# Altium integrated library Integrated Chips.IntLib: 79 symbols (continued)
## S9KEAZ128AMLK
designator U?
32-bit MCU core from ARM’s Cortex-M class, 1.77 CoreMark®/MHz from / single-cycle access memories, 48 MHz CPU frequency
footprint LQFP80_65P (LQFP, 80-Leads, Body 14.00x14.00mm, Pitch 0.65mm, IPC Medium Density)
pins: 1 PTD1/KBI0P25/FTM2CH3/MOSI1 (io), 2 PTD0/KBI0P24/FTM2CH2/SCK1 (io), 3 PTH7/KBI1P31/PWTIN1 (io), 4 PTH6/KBI1P30 (io), 5 PTH5/KBI1P29 (io), 6 PTE7/KBI1P7/TCLK2/FTM1CH1/CAN_TX (io), 7 PTH2/KBI1P26/BUSOUT/FTM1CH0/CAN_RX (io), 8 VDD1 (power), 9 VDDA/VREFH (power), 10 VREFH (power), 11 VREFL (power), 12 VSSA/VSS1 (power), 13 PTB7/KBI0P15/SCL0/EXTAL, 14 PTB6/KBI0P14/SDA0/XTAL, 15 PTI4/IRQ (io), 16 PTI1/IRQ/TX2 (io), 17 PTI0/IRQ/RX2 (io), 18 PTH1/KBI1P25/FTM2CH1 (io), 19 PTH0/KBI1P24/FTM2CH0 (io), 20 PTE6/KBI1P6 (io), 21 PTE5/KBI1P5 (io), 22 PTB5/KBI0P13/FTM2CH5/SS0/ACMP1_OUT (io), 23 PTB4/KBI0P12/FTM2CH4/MISO0/NMI/ACMP1_IN2 (io), 24 PTC3/KBI0P19/FTM2CH3/ADPC11 (io), 25 PTC2/KBI0P18/FTM2CH2/ADPC10 (io), 26 PTD7/KBI0P31/TX2 (io), 27 PTD6/KBI0P30/RX2 (io), 28 PTD5/KBI0P29/PWTIN0 (io), 29 PTI6/IRQ (io), 30 PTI5/IRQ (io), 31 PTC1/KBI0P17/FTM2CH1/ADPC9 (io), 32 PTC0/KBI0P16/FTM2CH0/ADPC8 (io), 33 PTH4/KBI1P28/SCL1 (io), 34 PTH3/KBI1P27/SDA1 (io), 35 PTF7/KBI1P15/ADPC15 (io), 36 PTF6/KBI1P14/ADPC14 (io), 37 PTF5/KBI1P13/ADPC13 (io), 38 PTF4/KBI1P12/ADPC12 (io), 39 PTB3/KBI0P11/MOSI0/FTM0CH1/ADPC7 (io), 40 PTB2/KBI0P10/SCK0/FTM0CH0/ADPC6 (io), 41 PTB1/KBI0P9/TX0/ADPC5 (io), 42 PTB0/KBI0P8/RX0/PWTIN1/ADPC4 (io), 43 PTF3/KBI1P11/TX1 (io), 44 PTF2/KBI1P10/RX1 (io), 45 PTA7/KBI0P7/FTM2FLT2/ACMP1_IN1/ADPC3 (io), 46 PTA6/KBI0P6/FTM2FLT1/ACMP1_IN0/ADPC2 (io), 47 PTE4/KBI1P4 (io), 48 VSS3 (power), 49 VDD3 (power), 50 PTG7/KBI1P23/FTM2CH5/SS1 (io), 51 PTG6/KBI1P22/FTM2CH4/MISO1 (io), 52 PTG5/KBI1P21/FTM2CH3/MOSI1 (io), 53 PTG4/KBI1P20/FTM2CH2/SCK1 (io), 54 PTF1/KBI1P9/FTM2CH1 (io), 55 PTF0/KBI1P8/FTM2CH0 (io), 56 PTD4/KBI0P28 (io), 57 PTD3/KBI0P27/SS1 (io), 58 PTD2/KBI0P26/MISO1 (io), 59 PTA3/KBI0P3/TX0/SCL0 (io), 60 PTA2/KBI0P2/RX0/SDA0 (io), 61 PTA1/KBI0P1/FTM0CH1/SDA0_OUT/ACMP0_IN1/ADPC1 (io), 62 PTA0/KBI0P0/FTM0CH0/SCL0_OUT/ACMP0_IN0/ADPC0 (io), 63 PTC7/KBI0P23/TX1/CAN_TX (io), 64 PTC6/KBI0P22/RX1/CAN_RX (io), 65 PTI3/IRQ (io), 66 PTI2/IRQ (io), 67 PTE3/KBI1P3/SS0 (io), 68 PTE2/KBI1P2/MISO0/PWTIN0 (io), 69 VSS2 (power), 70 VDD2 (power), 71 PTG3/KBI1P19 (io), 72 PTG2/KBI1P18 (io), 73 PTG1/KBI1P17 (io), 74 PTG0/KBI1P16 (io), 75 PTE1/KBI1P1/MOSI0/SCL1 (io), 76 PTE0/KBI1P0/SCK0/TCLK1/SDA1 (io), 77 PTC5/KBI0P21/FTM1CH1/RTCO (io), 78 PTC4/KBI0P20/RTCO/FTM1CH0/ACMP0_IN2/SWCLK (io), 79 PTA5/KBI0P5/IRQ/TCLK0/RESET (io), 80 PTA4/KBI0P4/ACMP0_OUT/SWDIO (io)

## SN65HVD230D
designator U?, comment SN65HVD232D
3.3V CAN Transceiver with Standby Mode, 17 mA, -40 to 85 degC, 8-pin SOIC (D), Green (RoHS & no Sb/Br); Manufacturer: Texas Instruments; PartNumber: SN65HVD230D; Drivers Per Package: 1; Transient Pulse Protection(V): -25 to 25; ICC(Max)(mA): 17; Supply Voltage(s)(V): 3.3; Rating: Catalog; DatasheetVersion: SLOS346K; PackageVersion: revM, Jun-2011; PackageReference: D8; PackageDescription: 8-Pin Plastic Small Outline Integrated Circuit, 4.9 x 3.9 mm, Pitch 1.27 mm Pitch; Supplier 1: Digi-Key; Supplier Part Number 1: SN65HVD230D-ND; Supplier 2: Farnell; Supplier Part Number 2: 1103105; Supplier 3: Newark; Supplier Part Number 3: 75C7744; Supplier 4: Mouser; Supplier Part Number 4: 595-SN65HVD230D; Eco-Plan: Green (RoHS & no Sb/Br); SubFamily: CAN; Receivers Per Package: 1; Isolated: No; Low Power Mode: Standby; Footprint: PCA82C250; Mounting Technology: Surface Mount; Code_JEDEC: MS-012AA; ComponentLink1Description: Datasheet; ComponentLink1URL: http://www.ti.com/general/docs/lit/getliterature.tsp?genericPartNumber=SN65HVD230&fileType=pdf
footprint SOIC8_150
pins: 1 D (in) "Driver input", 2 GND (power) "Ground", 3 VCC (power) "Supply voltage", 4 R (out) "Receiver output", 5 VREF (out) "Reference output", 6 CANL (io) "Low bus output", 7 CANH (io) "High bus output", 8 RS (in) "Standby/slope control"

## SN65HVD888
designator U?
RS-485 转发器  具有 IEC-ESD 保护的总线极性纠正 300bps 至 250kbps
footprint SOIC8_150
pins: 1 R, 2 ~{RE}, 3 DE, 4 D, 5 GND, 6 A, 7 B, 8 Vcc

## SN74LVC1G08
designator U?
footprint SOT23_5 (SOT23, 5-Leads, Body 2.90x2.70mm, Pitch 0.95mm, IPC Medium Density)
pins: 1 A, 2 B, 3 GND, 4 Y, 5 VCC

## SRV05-4
designator TVS?
footprint SOT23_6 (SOT23, 6-Leads, Body 2.90x2.80mm, Pitch 0.95mm, IPC Medium Density)
pins: 1, 2, 3, 4, 5, 6

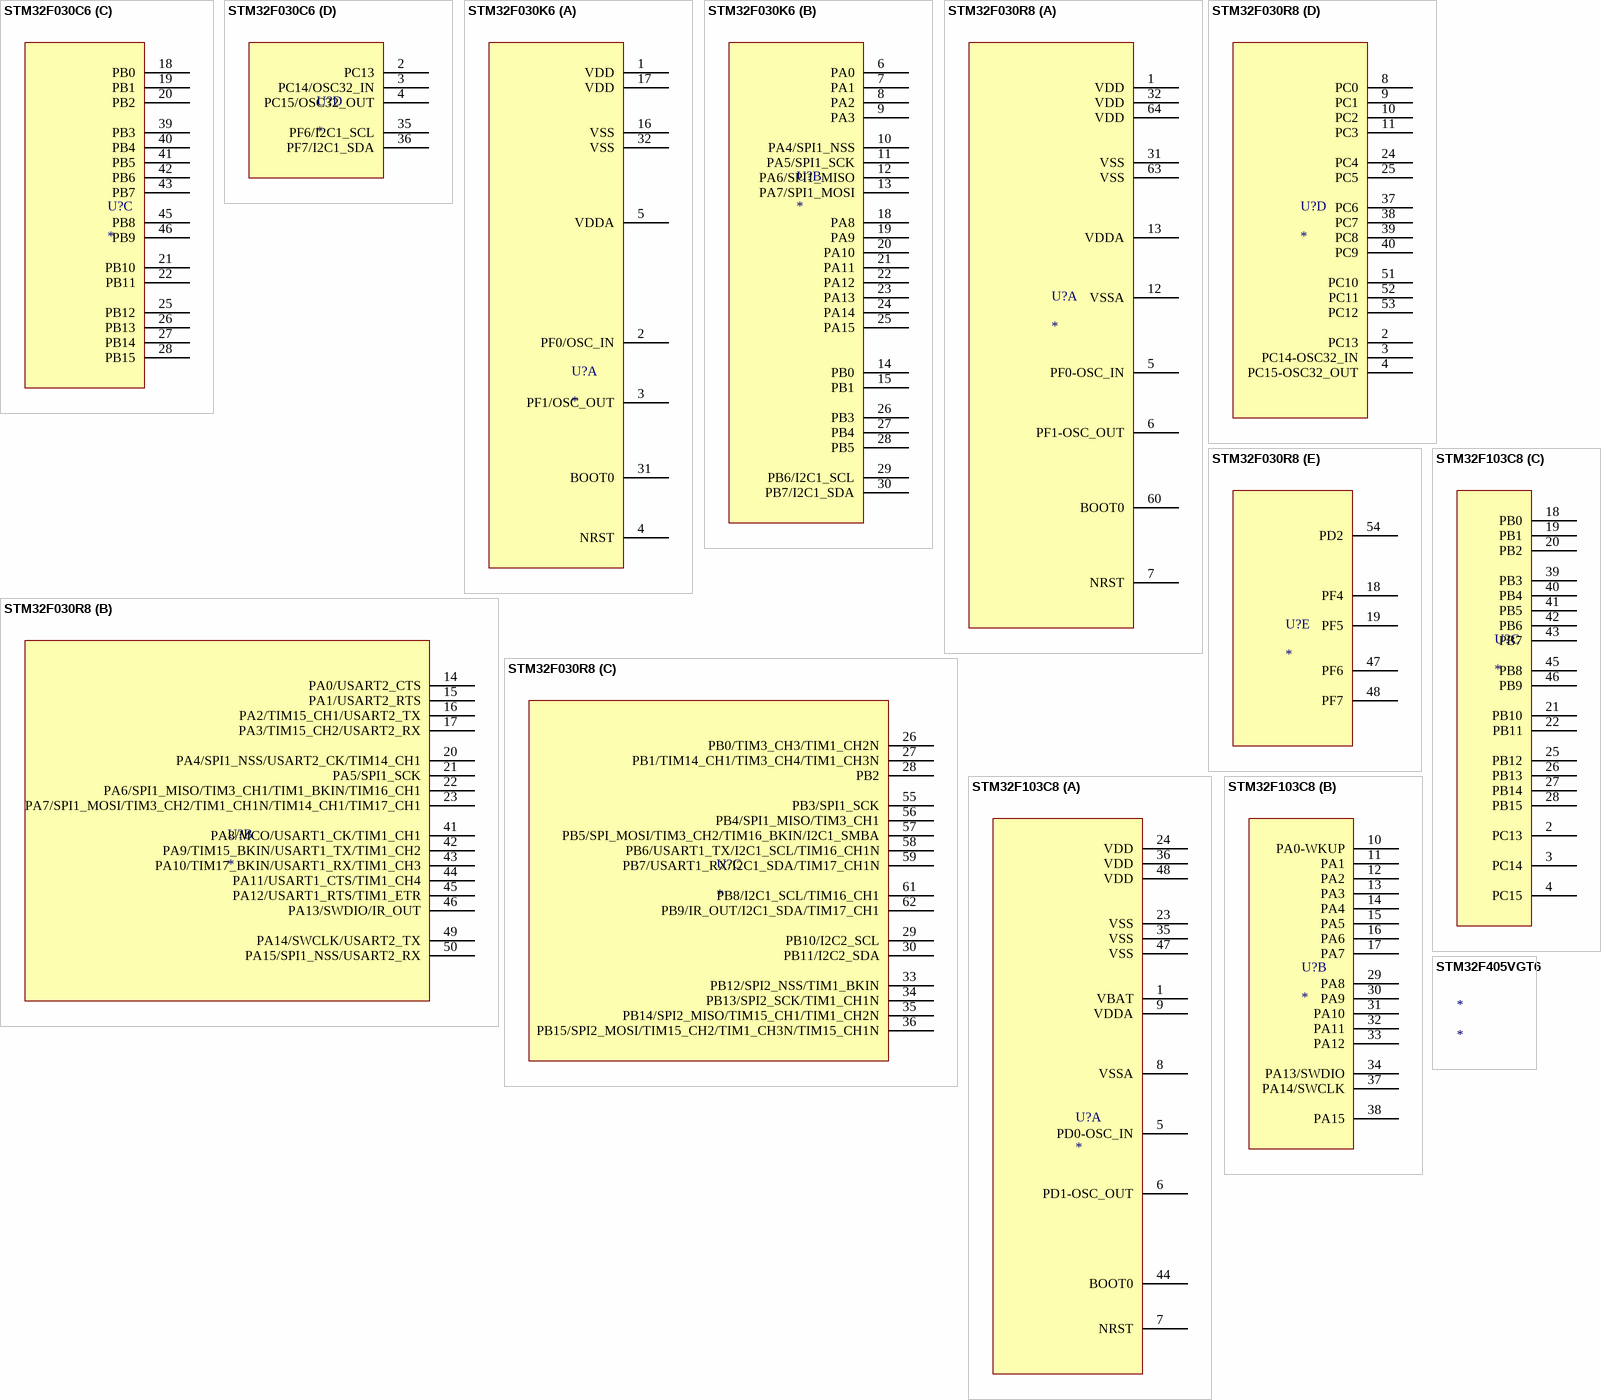
[diagram p3: symbols STM32F030C6 to STM32F405VGT6]

## STM32F030C6
designator U?
footprint LQFP48_50P (TSQFP, 48-Leads, Body 7.00x7.00mm, Pitch 0.50mm, IPC Medium Density)
part A pins: 1 VDD (power), 5 PF0/OSC_IN, 6 PF1/OSC_OUT, 7 NRST, 8 VSSA (power), 9 VDDA (power), 23 VSS (power), 24 VDD (power), 44 BOOT0, 47 VSS (power), 48 VDD (power)
part B pins: 10 PA0, 11 PA1, 12 PA2, 13 PA3, 14 PA4/SPI1_NSS, 15 PA5/SPI1_SCK, 16 PA6/SPI1_MISO, 17 PA7/SPI1_MOSI, 29 PA8, 30 PA9, 31 PA10, 32 PA11, 33 PA12, 34 PA13/SWDIO, 37 PA14/SWCLK, 38 PA15
part C pins: 18 PB0, 19 PB1, 20 PB2, 21 PB10, 22 PB11, 25 PB12, 26 PB13, 27 PB14, 28 PB15, 39 PB3, 40 PB4, 41 PB5, 42 PB6, 43 PB7, 45 PB8, 46 PB9
part D pins: 2 PC13, 3 PC14/OSC32_IN, 4 PC15/OSC32_OUT, 35 PF6/I2C1_SCL, 36 PF7/I2C1_SDA

## STM32F030K6
designator U?
footprint LQFP32_80P (TQFP, 32-Leads, Body 7.00x7.00mm, Pitch 0.80mm, IPC Medium Density)
part A pins: 1 VDD (power), 2 PF0/OSC_IN, 3 PF1/OSC_OUT, 4 NRST, 5 VDDA (power), 16 VSS (power), 17 VDD (power), 31 BOOT0, 32 VSS (power)
part B pins: 6 PA0, 7 PA1, 8 PA2, 9 PA3, 10 PA4/SPI1_NSS, 11 PA5/SPI1_SCK, 12 PA6/SPI1_MISO, 13 PA7/SPI1_MOSI, 14 PB0, 15 PB1, 18 PA8, 19 PA9, 20 PA10, 21 PA11, 22 PA12, 23 PA13, 24 PA14, 25 PA15, 26 PB3, 27 PB4, 28 PB5, 29 PB6/I2C1_SCL, 30 PB7/I2C1_SDA

## STM32F030R8
designator U?
footprint LQFP64_50P (TSQFP, 64-Leads, Body 10.00x10.00mm, Pitch 0.50mm, IPC Medium Density)
part A pins: 1 VDD (power), 5 PF0-OSC_IN, 6 PF1-OSC_OUT, 7 NRST, 12 VSSA (power), 13 VDDA (power), 31 VSS (power), 32 VDD (power), 60 BOOT0, 63 VSS (power), 64 VDD (power)
part B pins: 14 PA0/USART2_CTS, 15 PA1/USART2_RTS, 16 PA2/TIM15_CH1/USART2_TX, 17 PA3/TIM15_CH2/USART2_RX, 20 PA4/SPI1_NSS/USART2_CK/TIM14_CH1, 21 PA5/SPI1_SCK, 22 PA6/SPI1_MISO/TIM3_CH1/TIM1_BKIN/TIM16_CH1, 23 PA7/SPI1_MOSI/TIM3_CH2/TIM1_CH1N/TIM14_CH1/TIM17_CH1, 41 PA8/MCO/USART1_CK/TIM1_CH1, 42 PA9/TIM15_BKIN/USART1_TX/TIM1_CH2, 43 PA10/TIM17_BKIN/USART1_RX/TIM1_CH3, 44 PA11/USART1_CTS/TIM1_CH4, 45 PA12/USART1_RTS/TIM1_ETR, 46 PA13/SWDIO/IR_OUT, 49 PA14/SWCLK/USART2_TX, 50 PA15/SPI1_NSS/USART2_RX
part C pins: 26 PB0/TIM3_CH3/TIM1_CH2N, 27 PB1/TIM14_CH1/TIM3_CH4/TIM1_CH3N, 28 PB2, 29 PB10/I2C2_SCL, 30 PB11/I2C2_SDA, 33 PB12/SPI2_NSS/TIM1_BKIN, 34 PB13/SPI2_SCK/TIM1_CH1N, 35 PB14/SPI2_MISO/TIM15_CH1/TIM1_CH2N, 36 PB15/SPI2_MOSI/TIM15_CH2/TIM1_CH3N/TIM15_CH1N, 55 PB3/SPI1_SCK, 56 PB4/SPI1_MISO/TIM3_CH1, 57 PB5/SPI_MOSI/TIM3_CH2/TIM16_BKIN/I2C1_SMBA, 58 PB6/USART1_TX/I2C1_SCL/TIM16_CH1N, 59 PB7/USART1_RX/I2C1_SDA/TIM17_CH1N, 61 PB8/I2C1_SCL/TIM16_CH1, 62 PB9/IR_OUT/I2C1_SDA/TIM17_CH1
part D pins: 2 PC13, 3 PC14-OSC32_IN, 4 PC15-OSC32_OUT, 8 PC0, 9 PC1, 10 PC2, 11 PC3, 24 PC4, 25 PC5, 37 PC6, 38 PC7, 39 PC8, 40 PC9, 51 PC10, 52 PC11, 53 PC12
part E pins: 18 PF4, 19 PF5, 47 PF6, 48 PF7, 54 PD2

## STM32F103C8
designator U?
footprint Model Name (Footprint not found)
footprint LQFP48_50P (TSQFP, 48-Leads, Body 7.00x7.00mm, Pitch 0.50mm, IPC Medium Density)
part A pins: 1 VBAT (power), 5 PD0-OSC_IN, 6 PD1-OSC_OUT, 7 NRST, 8 VSSA (power), 9 VDDA (power), 23 VSS (power), 24 VDD (power), 35 VSS (power), 36 VDD (power), 44 BOOT0, 47 VSS (power), 48 VDD (power)
part B pins: 10 PA0-WKUP, 11 PA1, 12 PA2, 13 PA3, 14 PA4, 15 PA5, 16 PA6, 17 PA7, 29 PA8, 30 PA9, 31 PA10, 32 PA11, 33 PA12, 34 PA13/SWDIO, 37 PA14/SWCLK, 38 PA15
part C pins: 2 PC13, 3 PC14, 4 PC15, 18 PB0, 19 PB1, 20 PB2, 21 PB10, 22 PB11, 25 PB12, 26 PB13, 27 PB14, 28 PB15, 39 PB3, 40 PB4, 41 PB5, 42 PB6, 43 PB7, 45 PB8, 46 PB9

## STM32F405VGT6
designator *

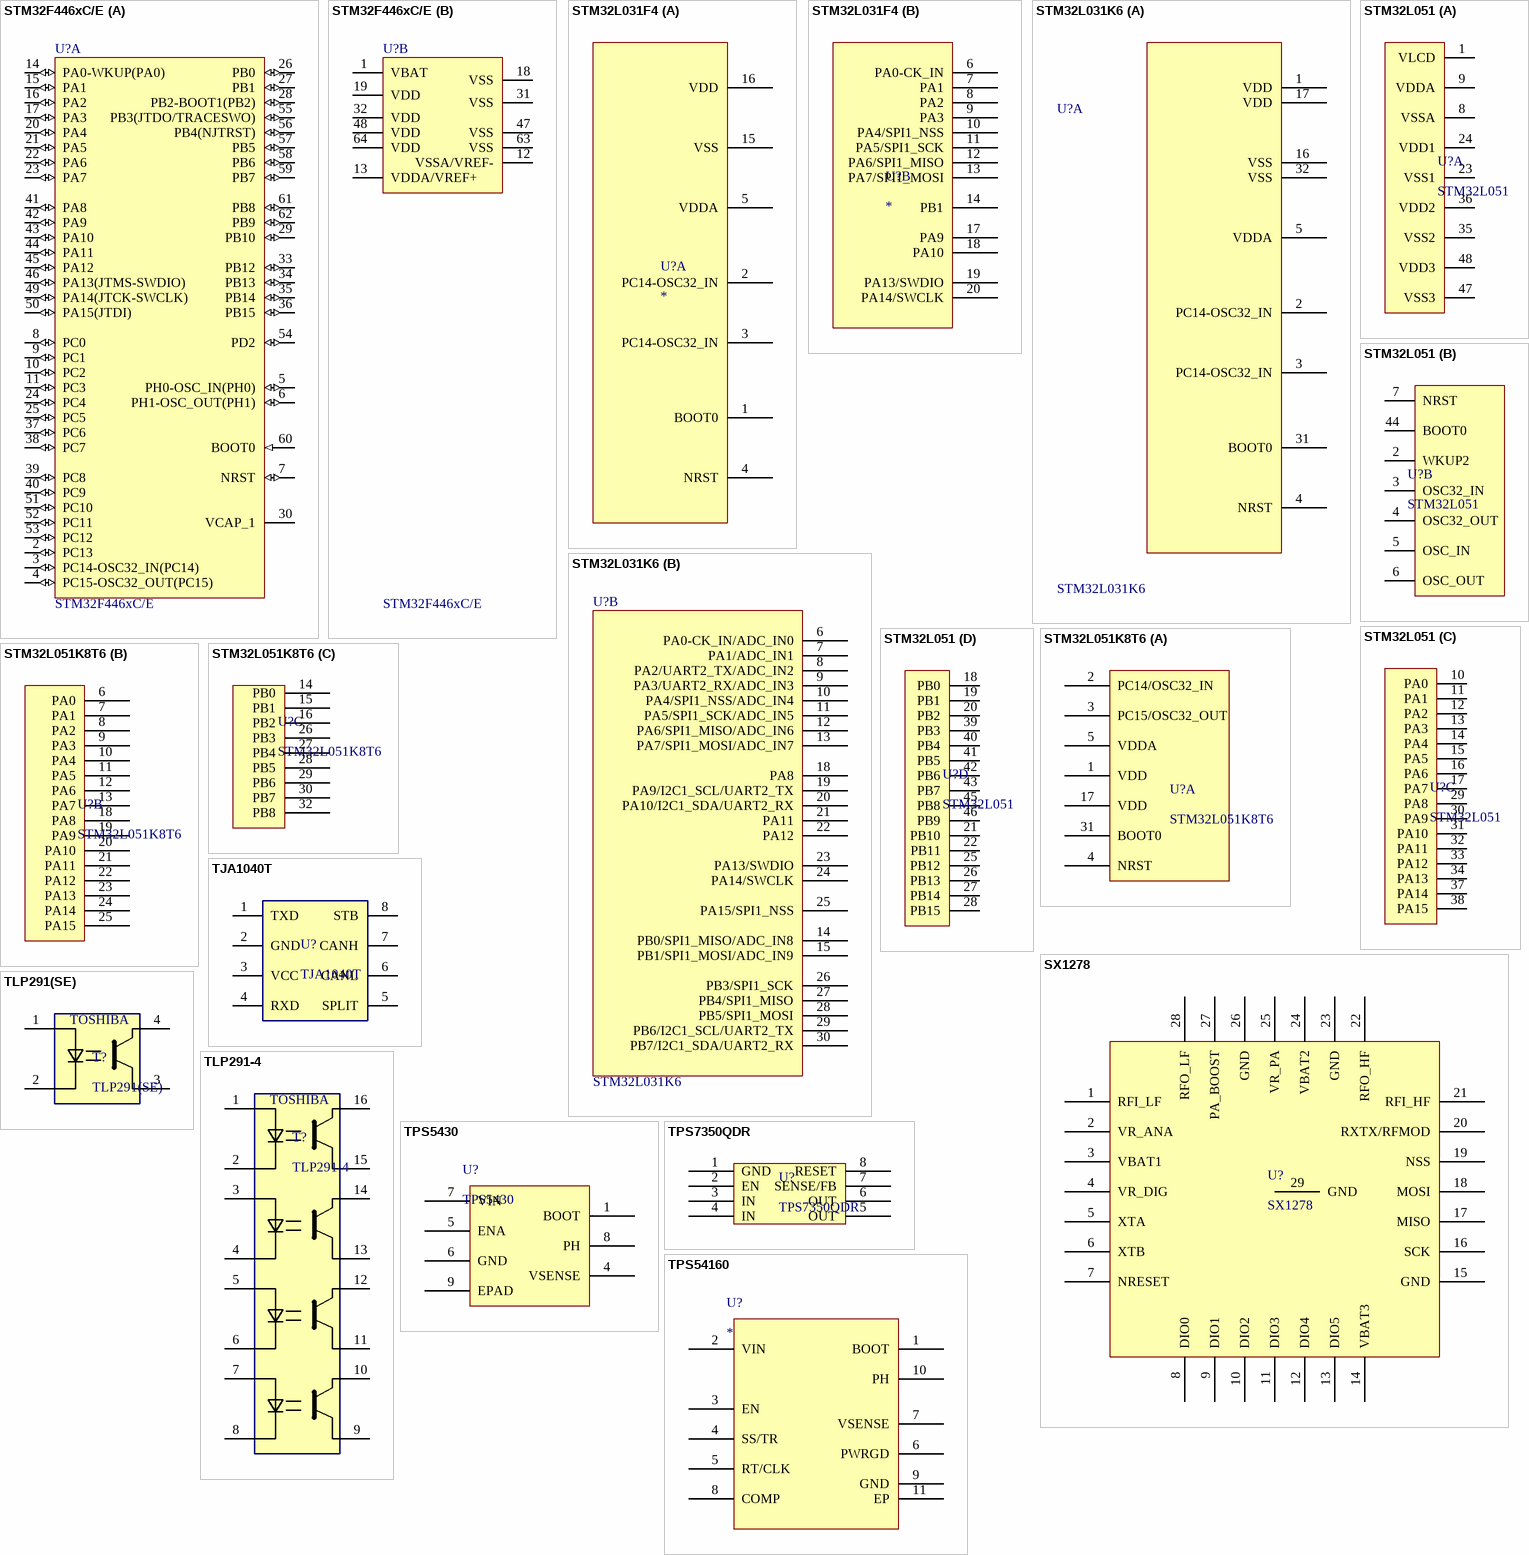
[diagram p4: symbols STM32F446xC/E to TPS54160]

## STM32F446xC/E
designator U?
ARM Cortex-M4 32-bit MCU+FPU, 210 DMIPS, 1024 kB Flash, 192 kB Internal RAM, 51 I/Os, 64-pin LQFP, -40 to 85 degC, Tray; Manufacturer: STMicroelectronics; PartNumber: STM32F405RGT6; D/A Converter: 2x12-bit; FLASH Size (Prog) (kB): 1024; I/Os (High Current): 51; Internal RAM Size (kB): 192; Operating Frequency(F) (Processor speed) (MHz): 168; Supply Voltage(Vcc) max (V): 3.6; Supply Voltage(Vcc) min (V): 1.8; DatasheetVersion: Rev. 4; PackageVersion: Rev. 4, 06/2013; PackageReference: LQFP64; PackageDescription: 64-Pin Low Profile Quad Flat Package, 10 x 10 mm Body, 0.5 mm Pitch; Supplier 1: Digi-Key; Supplier Part Number 1: 497-11767-ND; Supplier 2: Farnell; Supplier Part Number 2: 2064363; Supplier 3: Newark; Supplier Part Number 3: 73T2329; Supplier 4: Mouser; Supplier Part Number 4: 511-STM32F405RGT6; Core: ARM Cortex-M4; Packing: Tray; Mounting Technology: Surface Mount; ComponentLink1Description: Manufacturer URL; ComponentLink1URL: http://www.st.com/web/en/home.html; ComponentLink2Description: Datasheet; ComponentLink2URL: http://www.st.com/st-web-ui/static/active/en/resource/technical/document/datasheet/DM00037051.pdf; ComponentLink3Description: Package Specification; ComponentLink3URL: http://www.st.com/st-web-ui/static/active/en/resource/technical/document/datasheet/DM00037051.pdf
footprint LQFP64_50P (TSQFP, 64-Leads, Body 10.00x10.00mm, Pitch 0.50mm, IPC Medium Density)
part A pins: 2 PC13 (io) "PC13/EVENTOUT/RTC_OUT,RTC_TAMP1,RTC_TS", 3 PC14-OSC32_IN(PC14) (io) "PC14-OSC32_IN(PC14)/EVENTOUT/OSC32_IN", 4 PC15-OSC32_OUT(PC15) (io) "PC15-OSC32_OUT(PC15)/EVENTOUT/OSC32_OUT", 5 PH0-OSC_IN(PH0) (io) "PH0-OSC_IN(PH0)/EVENTOUT/OSC_IN", 6 PH1-OSC_OUT(PH1) (io) "PH1-OSC_OUT(PH1)/EVENTOUT/OSC_OUT", 7 NRST (io), 8 PC0 (io) "PC0/OTG_HS_ULPI_STP/EVENTOUT/ADC123_IN10", 9 PC1 (io) "PC1/ETH_MDC/EVENTOUT/ADC123_IN11", 10 PC2 (io) "PC2/SPI2_MISO/OTG_HS_ULPI_DIR/ETH_MII_TXD2/I2S2ext_SD/EVENTOUT/ADC123_IN12", 11 PC3 (io) "PC3/SPI2_MOSI/I2S2_SD/OTG_HS_ULPI_NXT/ETH_MII_TX_CLK/EVENTOUT/ADC123_IN13", 14 PA0-WKUP(PA0) (io) "PA0-WKUP(PA0)/USART2_CTS/UART4_TX/ETH_MII_CRS/TIM2_CH1_ETR/TIM5_CH1/TIM8_ETR/EVENTOUT/ADC123_IN0/WKUP", 15 PA1 (io) "PA1/USART2_RTS/UART4_RX/ETH_RMII_REF_CLK/ETH_MII_RX_CLK/TIM5_CH2/TIM2_CH2/EVENTOUT/ADC123_IN1", 16 PA2 (io) "PA2/USART2_TX/TIM5_CH3/TIM9_CH1/TIM2_CH3/ETH_MDIO/EVENTOUT/ADC123_IN2", 17 PA3 (io) "PA3/USART2_RX/TIM5_CH4/TIM9_CH2/TIM2_CH4/OTG_HS_ULPI_D0/ETH_MII_COL/EVENTOUT/ADC123_IN3", 20 PA4 (io) "PA4/SPI1_NSS/SPI3_NSS/USART2_CK/DCMI_HSYNC/OTG_HS_SOF/I2S3_WS/EVENTOUT/ADC12_IN4/DAC_OUT1", 21 PA5 (io) "PA5/SPI1_SCK/OTG_HS_ULPI_CK/TIM2_CH1_ETR/TIM8_CH1N/EVENTOUT/ADC12_IN5/DAC_OUT2", 22 PA6 (io) "PA6/SPI1_MISO/TIM8_BKIN/TIM13_CH1/DCMI_PIXCLK/TIM3_CH1/TIM1_BKIN/EVENTOUT/ADC12_IN6", 23 PA7 (io) "PA7/SPI1_MOSI/TIM8_CH1N/TIM14_CH1/TIM3_CH2/ETH_MII_RX_DV/TIM1_CH1N/ETH_RMII_CRS_DV/EVENTOUT/ADC12_IN7", 24 PC4 (io) "PC4/ETH_RMII_RX_D0/ETH_MII_RX_D0/EVENTOUT/ADC12_IN14", 25 PC5 (io) "PC5/ETH_RMII_RX_D1/ETH_MII_RX_D1/EVENTOUT/ADC12_IN15", 26 PB0 (io) "PB0/TIM3_CH3/TIM8_CH2N/OTG_HS_ULPI_D1/ETH_MII_RXD2/TIM1_CH2N/EVENTOUT/ADC12_IN8", 27 PB1 (io) "PB1/TIM3_CH4/TIM8_CH3N/OTG_HS_ULPI_D2/ETH_MII_RXD3/TIM1_CH3N/EVENTOUT/ADC12_IN9", 28 PB2-BOOT1(PB2) (io) "PB2-BOOT1(PB2)/EVENTOUT", 29 PB10 (io) "PB10/SPI2_SCK/I2S2_CK/I2C2_SCL/USART3_TX/OTG_HS_ULPI_D3/ETH_MII_RX_ER/TIM2_CH3/EVENTOUT", 30 VCAP_1 (power), 33 PB12 (io) "PB12/SPI2_NSS/I2S2_WS/I2C2_SMBA/USART3_CK/TIM1_BKIN/CAN2_RX/OTG_HS_ULPI_D5/ETH_RMII_TXD0/ETH_MII_TXD0/OTG_HS_ID/EVENTOUT", 34 PB13 (io) "PB13/SPI2_SCK/I2S2_CK/USART3_CTS/TIM1_CH1N/CAN2_TX/OTG_HS_ULPI_D6/ETH_RMII_TXD1/ETH_MII_TXD1/EVENTOUT/OTG_HS_VBUS", 35 PB14 (io) "PB14/SPI2_MISO/TIM1_CH2N/TIM12_CH1/OTG_HS_DM/USART3_RTS/TIM8_CH2N/I2S2ext_SD/EVENTOUT", 36 PB15 (io) "PB15/SPI2_MOSI/I2S2_SD/TIM1_CH3N/TIM8_CH3N/TIM12_CH2/OTG_HS_DP/EVENTOUT/RTC_REFIN", 37 PC6 (io) "PC6/I2S2_MCK/TIM8_CH1/SDIO_D6/USART6_TX/DCMI_D0/TIM3_CH1/EVENTOUT", 38 PC7 (io) "PC7/I2S3_MCK/TIM8_CH2/SDIO_D7/USART6_RX/DCMI_D1/TIM3_CH2/EVENTOUT", 39 PC8 (io) "PC8/TIM8_CH3/SDIO_D0/TIM3_CH3/USART6_CK/DCMI_D2/EVENTOUT", 40 PC9 (io) "PC9/I2S_CKIN/MCO2/TIM8_CH4/SDIO_D1/I2C3_SDA/DCMI_D3/TIM3_CH4/EVENTOUT", 41 PA8 (io) "PA8/MCO1/USART1_CK/TIM1_CH1/I2C3_SCL/OTG_FS_SOF/EVENTOUT", 42 PA9 (io) "PA9/USART1_TX/TIM1_CH2/I2C3_SMBA/DCMI_D0/EVENTOUT/OTG_FS_VBUS", 43 PA10 (io) "PA10/USART1_RX/TIM1_CH3/OTG_FS_ID/DCMI_D1/EVENTOUT", 44 PA11 (io) "PA11/USART1_CTS/CAN1_RX/TIM1_CH4/OTG_FS_DM/EVENTOUT", 45 PA12 (io) "PA12/USART1_RTS/CAN1_TX/TIM1_ETR/OTG_FS_DP/EVENTOUT", 46 PA13(JTMS-SWDIO) (io) "PA13(JTMS-SWDIO)/JTMS-SWDIO/EVENTOUT", 49 PA14(JTCK-SWCLK) (io) "PA14(JTCK-SWCLK)/JTCK-SWCLK/EVENTOUT", 50 PA15(JTDI) (io) "PA15(JTDI)/JTDI/SPI3_NSS/I2S3_WS/TIM2_CH1_ETR/SPI1_NSS/EVENTOUT", 51 PC10 (io) "PC10/SPI3_SCK/I2S3_CK/UART4_TX/SDIO_D2/DCMI_D8/USART3_TX/EVENTOUT", 52 PC11 (io) "PC11/UART4_RX/SPI3_MISO/SDIO_D3/DCMI_D4/USART3_RX/I2S3ext_SD/EVENTOUT", 53 PC12 (io) "PC12/UART5_TX/SDIO_CK/DCMI_D9/SPI3_MOSI/I2S3_SD/USART3_CK/EVENTOUT", 54 PD2 (io) "PD2/TIM3_ETR/UART5_RX/SDIO_CMD/DCMI_D11/EVENTOUT", 55 PB3(JTDO/TRACESWO) (io) "PB3(JTDO/TRACESWO)/JTDO/TRACESWO/SPI3_SCK/I2S3_CK/TIM2_CH2/SPI1_SCK/EVENTOUT", 56 PB4(NJTRST) (io) "PB4(NJTRST)/NJTRST/SPI3_MISO/TIM3_CH1/SPI1_MISO/I2S3ext_SD/EVENTOUT", 57 PB5 (io) "PB5/I2C1_SMBA/CAN2_RX/OTG_HS_ULPI_D7/ETH_PPS_OUT/TIM3_CH2/SPI1_MOSI/SPI3_MOSI/DCMI_D10/I2S3_SD/EVENTOUT", 58 PB6 (io) "PB6/I2C1_SCL/TIM4_CH1/CAN2_TX/DCMI_D5/USART1_TX/EVENTOUT", 59 PB7 (io) "PB7/I2C1_SDA/FSMC_NL/DCMI_VSYNC/USART1_RX/TIM4_CH2/EVENTOUT", 60 BOOT0 (in) "BOOT0/VPP", 61 PB8 (io) "PB8/TIM4_CH3/SDIO_D4/TIM10_CH1/DCMI_D6/ETH_MII_TXD3/I2C1_SCL/CAN1_RX/EVENTOUT", 62 PB9 (io) "PB9/SPI2_NSS/I2S2_WS/TIM4_CH4/TIM11_CH1/SDIO_D5/DCMI_D7/I2C1_SDA/CAN1_TX/EVENTOUT"
part B pins: 1 VBAT (power), 12 VSSA/VREF- (power) "VSSA", 13 VDDA/VREF+ (power) "VDDA", 18 VSS (power), 19 VDD (power), 31 VSS, 32 VDD (power), 47 VSS (power) "VCAP_2", 48 VDD (power), 63 VSS (power), 64 VDD (power)

## STM32L031F4
designator U?
footprint TSSOP20 (TSOP, 20-Leads, Body 6.50x4.40mm, Pitch 0.65mm, IPC Medium Density)
part A pins: 1 BOOT0, 2 PC14-OSC32_IN, 3 PC14-OSC32_IN, 4 NRST, 5 VDDA (power), 15 VSS (power), 16 VDD (power)
part B pins: 6 PA0-CK_IN, 7 PA1, 8 PA2, 9 PA3, 10 PA4/SPI1_NSS, 11 PA5/SPI1_SCK, 12 PA6/SPI1_MISO, 13 PA7/SPI1_MOSI, 14 PB1, 17 PA9, 18 PA10, 19 PA13/SWDIO, 20 PA14/SWCLK

## STM32L031K6
designator U?
footprint LQFP32_80P (TQFP, 32-Leads, Body 7.00x7.00mm, Pitch 0.80mm, IPC Medium Density)
part A pins: 1 VDD (power), 2 PC14-OSC32_IN, 3 PC14-OSC32_IN, 4 NRST, 5 VDDA (power), 16 VSS (power), 17 VDD (power), 31 BOOT0, 32 VSS (power)
part B pins: 6 PA0-CK_IN/ADC_IN0, 7 PA1/ADC_IN1, 8 PA2/UART2_TX/ADC_IN2, 9 PA3/UART2_RX/ADC_IN3, 10 PA4/SPI1_NSS/ADC_IN4, 11 PA5/SPI1_SCK/ADC_IN5, 12 PA6/SPI1_MISO/ADC_IN6, 13 PA7/SPI1_MOSI/ADC_IN7, 14 PB0/SPI1_MISO/ADC_IN8, 15 PB1/SPI1_MOSI/ADC_IN9, 18 PA8, 19 PA9/I2C1_SCL/UART2_TX, 20 PA10/I2C1_SDA/UART2_RX, 21 PA11, 22 PA12, 23 PA13/SWDIO, 24 PA14/SWCLK, 25 PA15/SPI1_NSS, 26 PB3/SPI1_SCK, 27 PB4/SPI1_MISO, 28 PB5/SPI1_MOSI, 29 PB6/I2C1_SCL/UART2_TX, 30 PB7/I2C1_SDA/UART2_RX

## STM32L051
designator U?
footprint LQFP48_50P (TSQFP, 48-Leads, Body 7.00x7.00mm, Pitch 0.50mm, IPC Medium Density)
part A pins: 1 VLCD, 8 VSSA, 9 VDDA, 23 VSS1, 24 VDD1, 35 VSS2, 36 VDD2, 47 VSS3, 48 VDD3
part B pins: 2 WKUP2, 3 OSC32_IN, 4 OSC32_OUT, 5 OSC_IN, 6 OSC_OUT, 7 NRST, 44 BOOT0
part C pins: 10 PA0, 11 PA1, 12 PA2, 13 PA3, 14 PA4, 15 PA5, 16 PA6, 17 PA7, 29 PA8, 30 PA9, 31 PA10, 32 PA11, 33 PA12, 34 PA13, 37 PA14, 38 PA15
part D pins: 18 PB0, 19 PB1, 20 PB2, 21 PB10, 22 PB11, 25 PB12, 26 PB13, 27 PB14, 28 PB15, 39 PB3, 40 PB4, 41 PB5, 42 PB6, 43 PB7, 45 PB8, 46 PB9

## STM32L051K8T6
designator U?
footprint QFN32_50_EP_N (QFN, 32-Leads, Body 5x5mm, Pitch 0.5mm, IPC Medium Density)
part A pins: 1 VDD, 2 PC14/OSC32_IN, 3 PC15/OSC32_OUT, 4 NRST, 5 VDDA, 17 VDD, 31 BOOT0
part B pins: 6 PA0, 7 PA1, 8 PA2, 9 PA3, 10 PA4, 11 PA5, 12 PA6, 13 PA7, 18 PA8, 19 PA9, 20 PA10, 21 PA11, 22 PA12, 23 PA13, 24 PA14, 25 PA15
part C pins: 14 PB0, 15 PB1, 16 PB2, 26 PB3, 27 PB4, 28 PB5, 29 PB6, 30 PB7, 32 PB8

## SX1278
designator U?
137MHz to 525MHz Long Range Low Power Transceiver
footprint QFN28_65P_EP
pins: 1 RFI_LF, 2 VR_ANA, 3 VBAT1, 4 VR_DIG, 5 XTA, 6 XTB, 7 NRESET, 8 DIO0, 9 DIO1, 10 DIO2, 11 DIO3, 12 DIO4, 13 DIO5, 14 VBAT3, 15 GND, 16 SCK, 17 MISO, 18 MOSI, 19 NSS, 20 RXTX/RFMOD, 21 RFI_HF, 22 RFO_HF, 23 GND, 24 VBAT2, 25 VR_PA, 26 GND, 27 PA_BOOST, 28 RFO_LF, 29 GND

## TJA1040T
designator U?
High speed CAN transceiver
footprint SOIC8_150
pins: 1 TXD, 2 GND, 3 VCC, 4 RXD, 5 SPLIT, 6 CANL, 7 CANH, 8 STB

## TLP291(SE)
designator T?
Photocouplers GaAs Infrared LED & Photo Transistor
footprint SOP4
pins: 1 A, 2 C, 3 E, 4 C
text: TOSHIBA

## TLP291-4
designator T?
Photocouplers GaAs Infrared LED & Photo Transistor
footprint SOIC16_180
pins: 1 A, 2 C, 3 A, 4 C, 5 A, 6 C, 7 A, 8 C, 9 E, 10 C, 11 E, 12 C, 13 E, 14 C, 15 E, 16 C
text: TOSHIBA

## TPS5430
designator U?
footprint SOIC8_150_EP (SOIC, 8-Leads, Body 4.90x3.90mm, Pitch 1.27mm, Thermal Pad 3.17x2.43mm, IPC Medium Density)
pins: 1 BOOT, 4 VSENSE, 5 ENA, 6 GND, 7 VIN, 8 PH, 9 EPAD

## TPS7350QDR
designator U?
TPS7350Q / LOW-DROPOUT VOLTAGE REGULATORS / WITH INTEGRATED DELAYED RESET FUNCTION
footprint SOIC8_150
pins: 1 GND, 2 EN, 3 IN, 4 IN, 5 OUT, 6 OUT, 7 SENSE/FB, 8 RESET

## TPS54160
designator U?
footprint MSOP10_EP
pins: 1 BOOT, 2 VIN (power), 3 EN, 4 SS/TR, 5 RT/CLK, 6 PWRGD, 7 VSENSE, 8 COMP, 9 GND (power), 10 PH, 11 EP

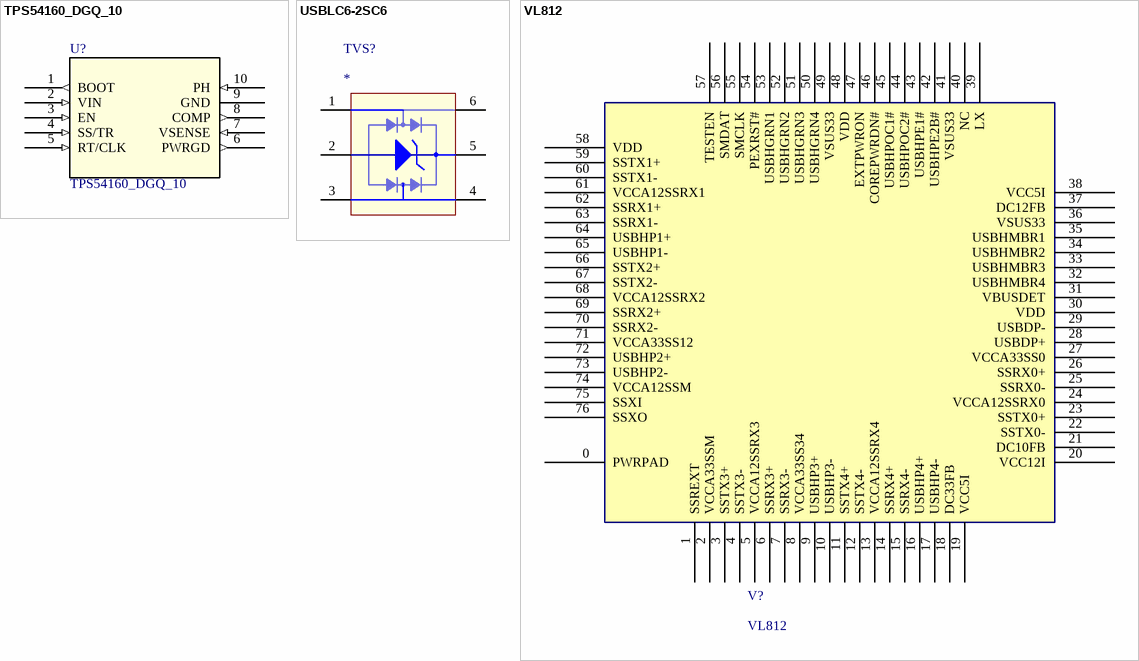
[diagram p5: symbols TPS54160_DGQ_10 to VL812]

## TPS54160_DGQ_10
designator U?
Imported; Vendor: Texas Instruments; PACKAGE_DESIGNATOR: DGQ; PIN_COUNT: 10; FAMILY_NAME: STEP-DOWN REGULATOR; INDUSTRY_STD_PKG_TYPE: MSOP-PowerPAD; Manufacturer_Part_Number: tps54160_dgq_10; GENERIC_PART_NUMBER: TPS54160; Manufacturer: Texas Instruments; Datasheet_URL: http://www.ti.com/lit/gpn/TPS54160; Value: Value; Type: Type; RefDes: RefDes
footprint MSOP10_EP
pins: 1 BOOT (out), 2 VIN (in), 3 EN (in), 4 SS/TR (in), 5 RT/CLK (in), 6 PWRGD (out), 7 VSENSE (in), 8 COMP (out), 9 GND (power), 10 PH (in)

## USBLC6-2SC6
designator TVS?
footprint SOT23_6 (SOT23, 6-Leads, Body 2.90x2.80mm, Pitch 0.95mm, IPC Medium Density)
pins: 1 I/O1, 2, 3, 4, 5 Vbus, 6

## VL812
designator V?
VIA_Lab_USB 3.0 Hub Controller
footprint QFN76_40P_EP
pins: 0 PWRPAD, 1 SSREXT, 2 VCCA33SSM, 3 SSTX3+, 4 SSTX3-, 5 VCCA12SSRX3, 6 SSRX3+, 7 SSRX3-, 8 VCCA33SS34, 9 USBHP3+, 10 USBHP3-, 11 SSTX4+, 12 SSTX4-, 13 VCCA12SSRX4, 14 SSRX4+, 15 SSRX4-, 16 USBHP4+, 17 USBHP4-, 18 DC33FB, 19 VCC5I, 20 VCC12I, 21 DC10FB, 22 SSTX0-, 23 SSTX0+, 24 VCCA12SSRX0, 25 SSRX0-, 26 SSRX0+, 27 VCCA33SS0, 28 USBDP+, 29 USBDP-, 30 VDD, 31 VBUSDET, 32 USBHMBR4, 33 USBHMBR3, 34 USBHMBR2, 35 USBHMBR1, 36 VSUS33, 37 DC12FB, 38 VCC5I, 39 LX, 40 NC, 41 VSUS33, 42 USBHPE2B#, 43 USBHPE1#, 44 USBHPOC2#, 45 USBHPOC1#, 46 COREPWRDN#, 47 EXTPWRON, 48 VDD, 49 VSUS33, 50 USBHGRN4, 51 USBHGRN3, 52 USBHGRN2, 53 USBHGRN1, 54 PEXRST#, 55 SMCLK, 56 SMDAT, 57 TESTEN, 58 VDD, 59 SSTX1+, 60 SSTX1-, 61 VCCA12SSRX1, 62 SSRX1+, 63 SSRX1-, 64 USBHP1+, 65 USBHP1-, 66 SSTX2+, 67 SSTX2-, 68 VCCA12SSRX2, 69 SSRX2+, 70 SSRX2-, 71 VCCA33SS12, 72 USBHP2+, 73 USBHP2-, 74 VCCA12SSM, 75 SSXI, 76 SSXO